# Altium schematic symbol library LATTICEPLDS_Library.SchLib: 291 symbols (part 4 of 32)
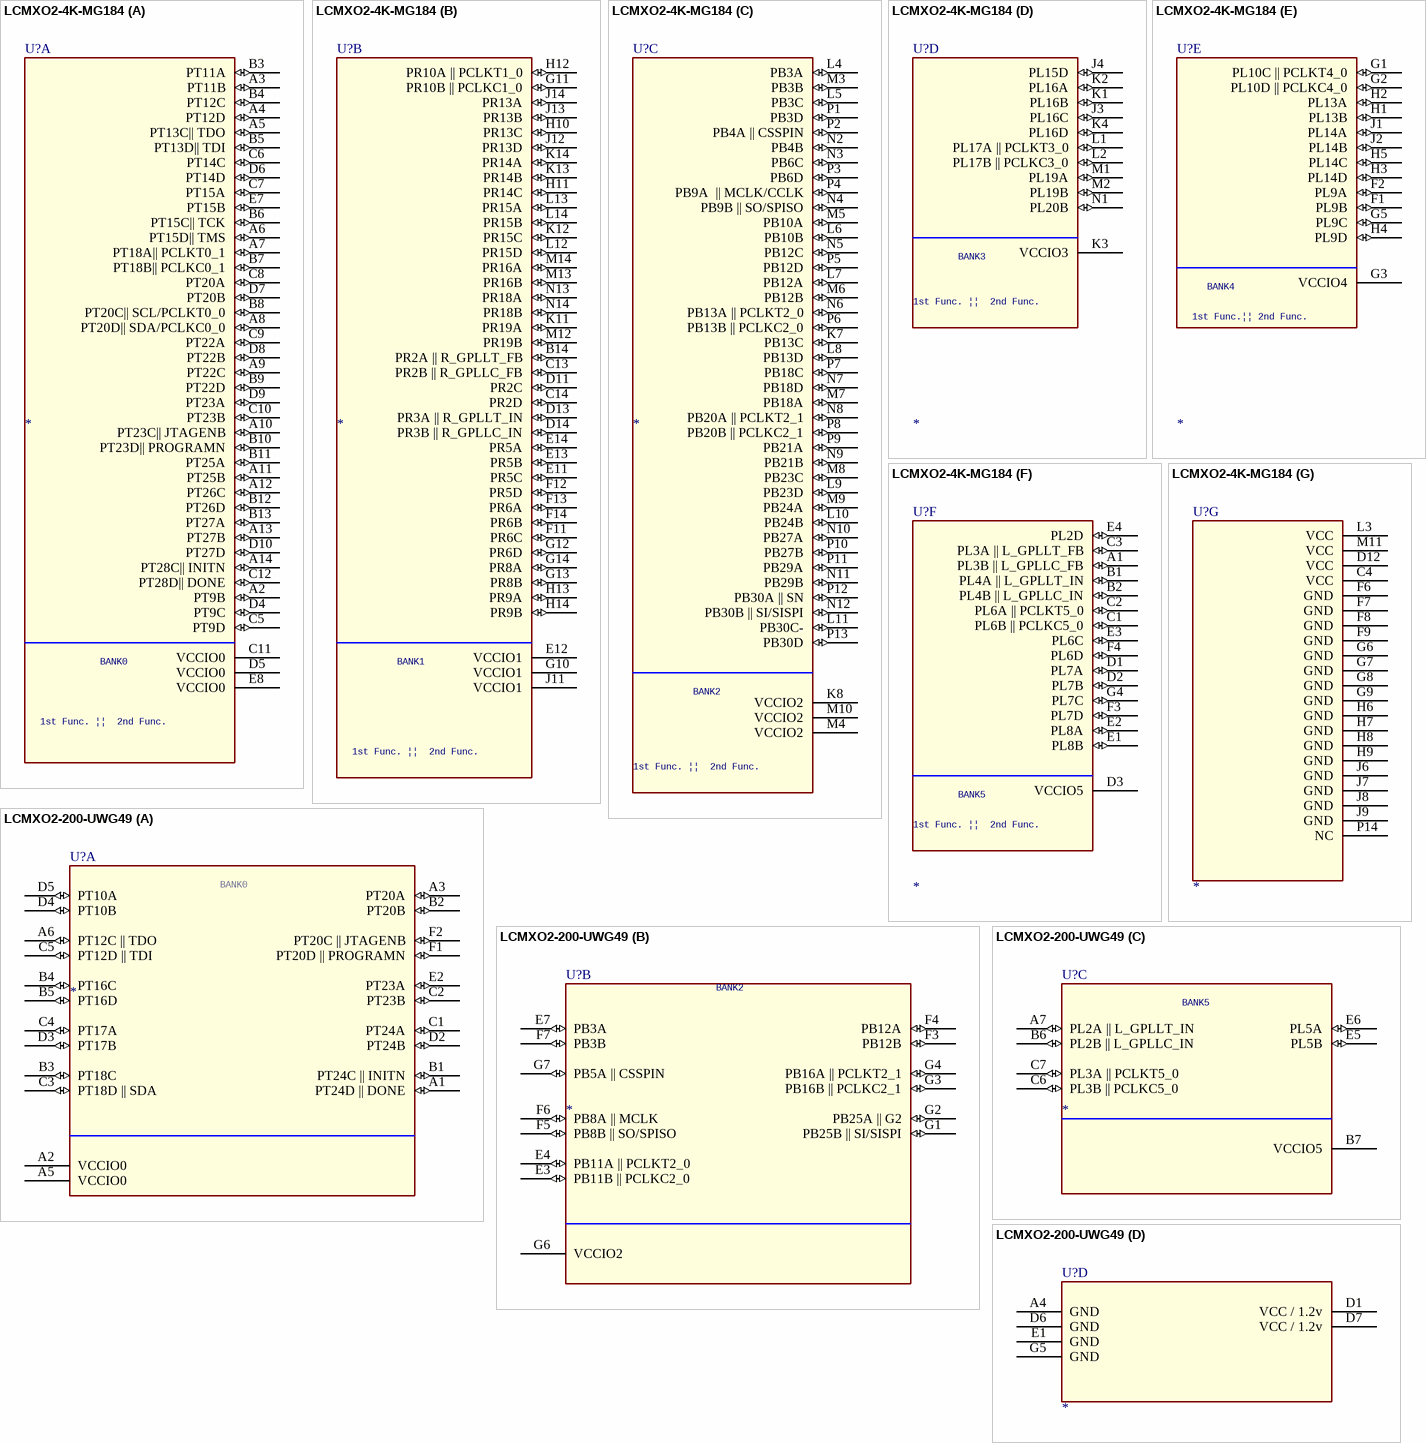
[diagram p306: symbols LCMXO2-4K-MG184 to LCMXO2-200-UWG49]

## LCMXO2-4K-MG184
designator U?
SPLIT_INST: TRUE; SWAP_INFO: (S1+S2+S3+S4+S5+S6+S7)
part A pins: A2 PT9B (io), A3 PT11B (io), A4 PT12D (io), A5 PT13C|| TDO (io), A6 PT15D|| TMS (io), A7 PT18A|| PCLKT0_1 (io), A8 PT20D|| SDA/PCLKC0_0 (io), A9 PT22C (io), A10 PT23C|| JTAGENB (io), A11 PT25B (io), A12 PT26C (io), A13 PT27B (io), A14 PT28C|| INITN (io), B3 PT11A (io), B4 PT12C (io), B5 PT13D|| TDI (io), B6 PT15C|| TCK (io), B7 PT18B|| PCLKC0_1 (io), B8 PT20C|| SCL/PCLKT0_0 (io), B9 PT22D (io), B10 PT23D|| PROGRAMN (io), B11 PT25A (io), B12 PT26D (io), B13 PT27A (io), C5 PT9D (io), C6 PT14C (io), C7 PT15A (io), C8 PT20A (io), C9 PT22A (io), C10 PT23B (io), C11 VCCIO0 (power), C12 PT28D|| DONE (io), D4 PT9C (io), D5 VCCIO0 (power), D6 PT14D (io), D7 PT20B (io), D8 PT22B (io), D9 PT23A (io), D10 PT27D (io), E7 PT15B (io), E8 VCCIO0 (power)
part B pins: B14 PR2A || R_GPLLT_FB (io), C13 PR2B || R_GPLLC_FB (io), C14 PR2D (io), D11 PR2C (io), D13 PR3A || R_GPLLT_IN (io), D14 PR3B || R_GPLLC_IN (io), E11 PR5C (io), E12 VCCIO1 (power), E13 PR5B (io), E14 PR5A (io), F11 PR6C (io), F12 PR5D (io), F13 PR6A (io), F14 PR6B (io), G10 VCCIO1 (power), G11 PR10B || PCLKC1_0 (io), G12 PR6D (io), G13 PR8B (io), G14 PR8A (io), H10 PR13C (io), H11 PR14C (io), H12 PR10A || PCLKT1_0 (io), H13 PR9A (io), H14 PR9B (io), J11 VCCIO1 (power), J12 PR13D (io), J13 PR13B (io), J14 PR13A (io), K11 PR19A (io), K12 PR15C (io), K13 PR14B (io), K14 PR14A (io), L12 PR15D (io), L13 PR15A (io), L14 PR15B (io), M12 PR19B (io), M13 PR16B (io), M14 PR16A (io), N13 PR18A (io), N14 PR18B (io)
part C pins: K7 PB13C (io), K8 VCCIO2 (power), L4 PB3A (io), L5 PB3C (io), L6 PB10B (io), L7 PB12A (io), L8 PB13D (io), L9 PB23D (io), L10 PB24B (io), L11 PB30C- (io), M3 PB3B (io), M4 VCCIO2 (power), M5 PB10A (io), M6 PB12B (io), M7 PB18A (io), M8 PB23C (io), M9 PB24A (io), M10 VCCIO2 (power), N2 PB4B (io), N3 PB6C (io), N4 PB9B || SO/SPISO (io), N5 PB12C (io), N6 PB13A || PCLKT2_0 (io), N7 PB18D (io), N8 PB20A || PCLKT2_1 (io), N9 PB21B (io), N10 PB27A (io), N11 PB29B (io), N12 PB30B || SI/SISPI (io), P1 PB3D (io), P2 PB4A || CSSPIN (io), P3 PB6D (io), P4 PB9A  || MCLK/CCLK (io), P5 PB12D (io), P6 PB13B || PCLKC2_0 (io), P7 PB18C (io), P8 PB20B || PCLKC2_1 (io), P9 PB21A (io), P10 PB27B (io), P11 PB29A (io), P12 PB30A || SN (io), P13 PB30D (io)
part D pins: J3 PL16C (io), J4 PL15D (io), K1 PL16B (io), K2 PL16A (io), K3 VCCIO3 (power), K4 PL16D (io), L1 PL17A || PCLKT3_0 (io), L2 PL17B || PCLKC3_0 (io), M1 PL19A (io), M2 PL19B (io), N1 PL20B (io)
part E pins: F1 PL9B (io), F2 PL9A (io), G1 PL10C || PCLKT4_0 (io), G2 PL10D || PCLKC4_0 (io), G3 VCCIO4 (power), G5 PL9C (io), H1 PL13B (io), H2 PL13A (io), H3 PL14D (io), H4 PL9D (io), H5 PL14C (io), J1 PL14A (io), J2 PL14B (io)
part F pins: A1 PL3B || L_GPLLC_FB (io), B1 PL4A || L_GPLLT_IN (io), B2 PL4B || L_GPLLC_IN (io), C1 PL6B || PCLKC5_0 (io), C2 PL6A || PCLKT5_0 (io), C3 PL3A || L_GPLLT_FB (io), D1 PL7A (io), D2 PL7B (io), D3 VCCIO5 (power), E1 PL8B (io), E2 PL8A (io), E3 PL6C (io), E4 PL2D (io), F3 PL7D (io), F4 PL6D (io), G4 PL7C (io)
part G pins: C4 VCC (power), D12 VCC (power), F6 GND (power), F7 GND (power), F8 GND (power), F9 GND (power), G6 GND (power), G7 GND (power), G8 GND (power), G9 GND (power), H6 GND (power), H7 GND (power), H8 GND (power), H9 GND (power), J6 GND (power), J7 GND (power), J8 GND (power), J9 GND (power), L3 VCC (power), M11 VCC (power), P14 NC
part A text: BANK0; 1st Func. ||  2nd Func.
part B text: BANK1; 1st Func. ||  2nd Func.
part C text: BANK2; 1st Func. ||  2nd Func.
part D text: BANK3; 1st Func. ||  2nd Func.
part E text: BANK4; 1st Func.|| 2nd Func.
part F text: BANK5; 1st Func. ||  2nd Func.

## LCMXO2-200-UWG49
designator U?
SWAP_INFO: (S1+S2+S3+S4); SPLIT_INST: TRUE
part A pins: A1 PT24D || DONE (io), A2 VCCIO0 (power), A3 PT20A (io), A5 VCCIO0 (power), A6 PT12C || TDO (io), B1 PT24C || INITN (io), B2 PT20B (io), B3 PT18C (io), B4 PT16C (io), B5 PT16D (io), C1 PT24A (io), C2 PT23B (io), C3 PT18D || SDA (io), C4 PT17A (io), C5 PT12D || TDI (io), D2 PT24B (io), D3 PT17B (io), D4 PT10B (io), D5 PT10A (io), E2 PT23A (io), F1 PT20D || PROGRAMN (io), F2 PT20C || JTAGENB (io)
part B pins: E3 PB11B || PCLKC2_0 (io), E4 PB11A || PCLKT2_0 (io), E7 PB3A (io), F3 PB12B (io), F4 PB12A (io), F5 PB8B || SO/SPISO (io), F6 PB8A || MCLK (io), F7 PB3B (io), G1 PB25B || SI/SISPI (io), G2 PB25A || G2 (io), G3 PB16B || PCLKC2_1 (io), G4 PB16A || PCLKT2_1 (io), G6 VCCIO2 (power), G7 PB5A || CSSPIN (io)
part C pins: A7 PL2A || L_GPLLT_IN (io), B6 PL2B || L_GPLLC_IN (io), B7 VCCIO5 (power), C6 PL3B || PCLKC5_0 (io), C7 PL3A || PCLKT5_0 (io), E5 PL5B (io), E6 PL5A (io)
part D pins: A4 GND (power), D1 VCC / 1.2v (power), D6 GND (power), D7 VCC / 1.2v (power), E1 GND (power), G5 GND (power)
part A text: BANK0
part B text: BANK2
part C text: BANK5

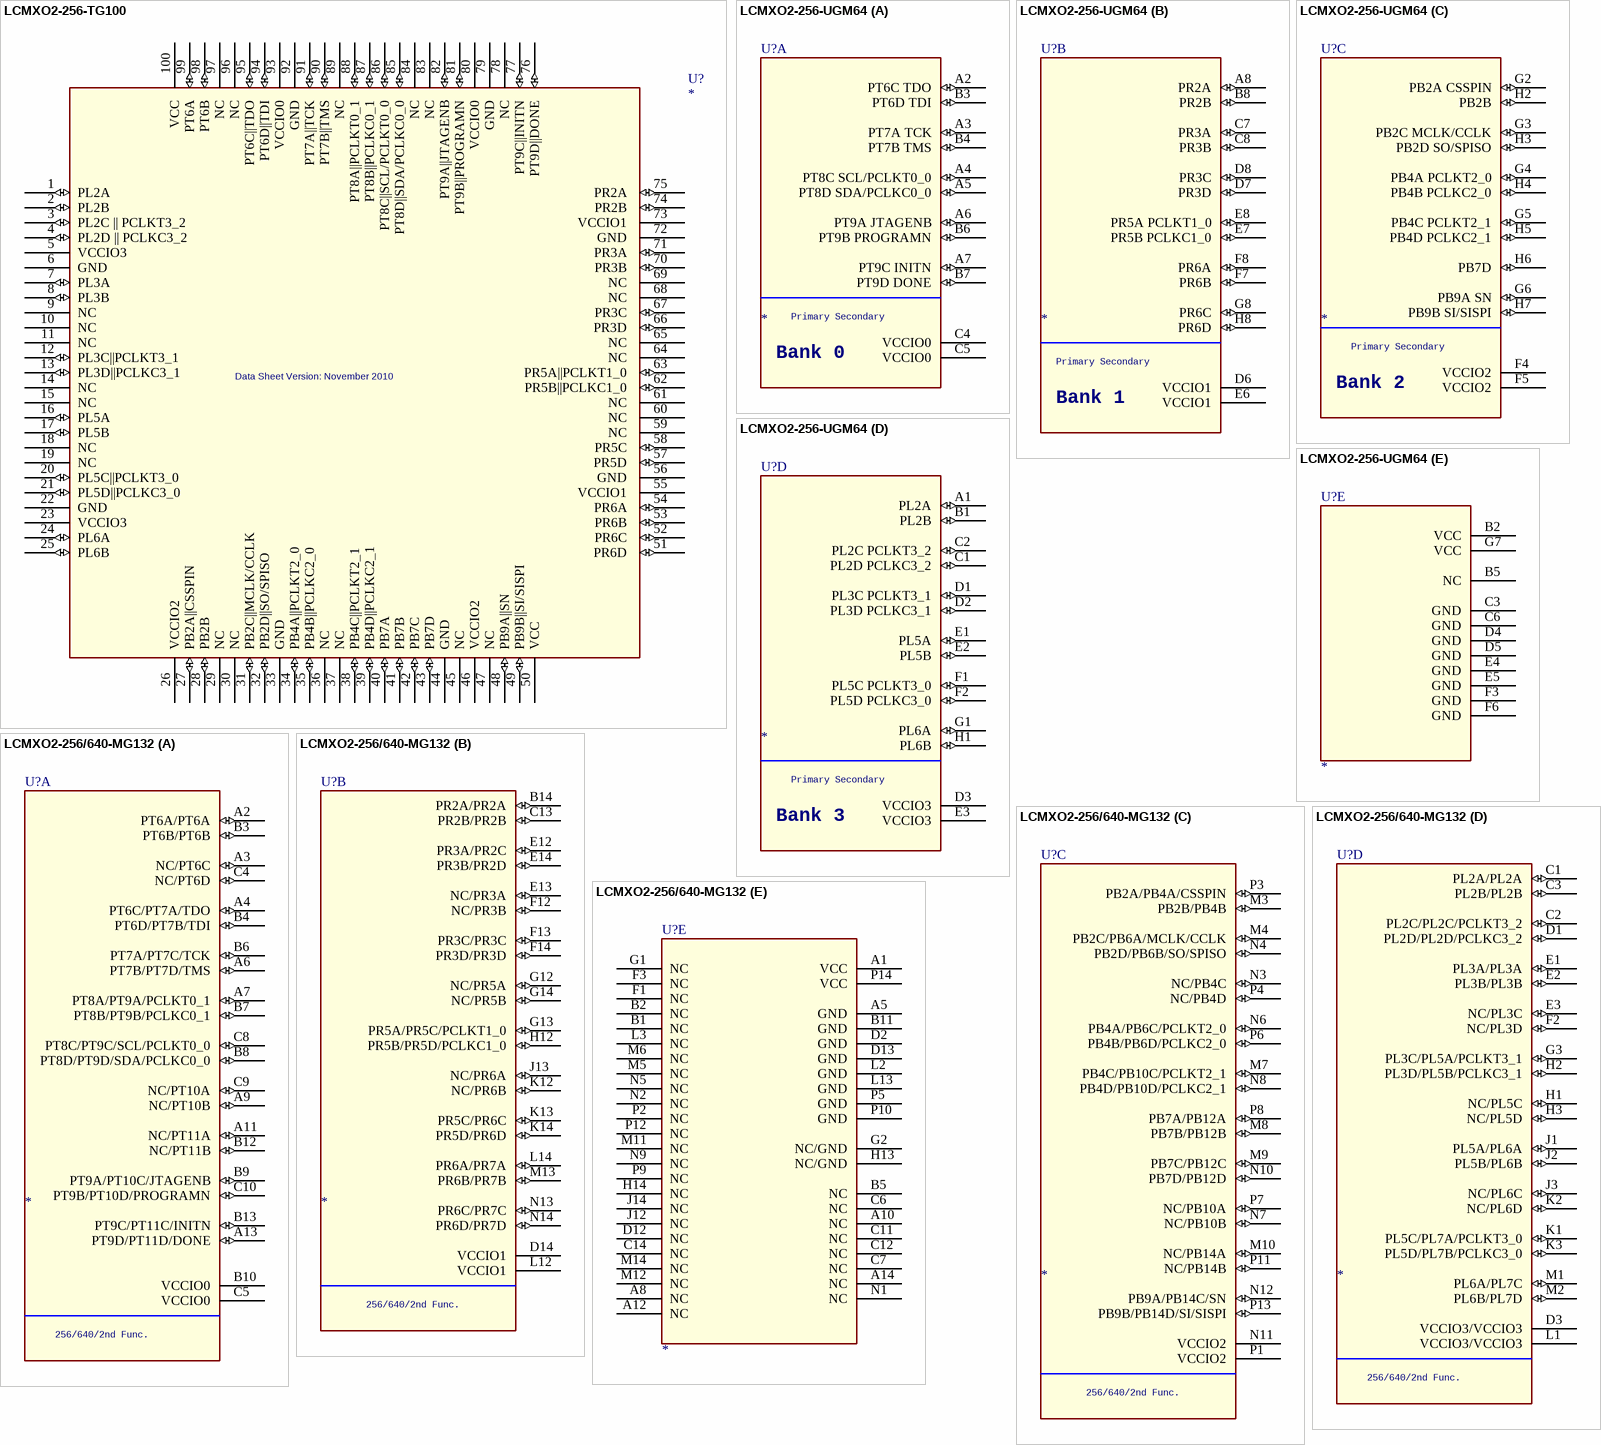
[diagram p36: symbols LCMXO2-256-TG100 to LCMXO2-256/640-MG132]

## LCMXO2-256-TG100
designator U?  Data Sheet Version: November 2010
pins: 1 PL2A  (io), 2 PL2B  (io), 3 PL2C || PCLKT3_2  (io), 4 PL2D || PCLKC3_2  (io), 5 VCCIO3  (power), 6 GND  (power), 7 PL3A  (io), 8 PL3B  (io), 9 NC , 10 NC , 11 NC , 12 PL3C||PCLKT3_1  (io), 13 PL3D||PCLKC3_1  (io), 14 NC , 15 NC , 16 PL5A  (io), 17 PL5B  (io), 18 NC , 19 NC , 20 PL5C||PCLKT3_0  (io), 21 PL5D||PCLKC3_0  (io), 22 GND  (power), 23 VCCIO3  (power), 24 PL6A  (io), 25 PL6B  (io), 26 VCCIO2  (power), 27 PB2A||CSSPIN  (io), 28 PB2B  (io), 29 NC , 30 NC , 31 PB2C||MCLK/CCLK  (io), 32 PB2D||SO/SPISO  (io), 33 GND  (power), 34 PB4A||PCLKT2_0  (io), 35 PB4B||PCLKC2_0  (io), 36 NC , 37 NC , 38 PB4C||PCLKT2_1  (io), 39 PB4D||PCLKC2_1  (io), 40 PB7A  (io), 41 PB7B  (io), 42 PB7C  (io), 43 PB7D  (io), 44 GND  (power), 45 NC , 46 VCCIO2  (power), 47 NC , 48 PB9A||SN  (io), 49 PB9B||SI/SISPI  (io), 50 VCC  (power), 51 PR6D  (io), 52 PR6C  (io), 53 PR6B  (io), 54 PR6A  (io), 55 VCCIO1  (power), 56 GND  (power), 57 PR5D  (io), 58 PR5C  (io), 59 NC , 60 NC , 61 NC , 62 PR5B||PCLKC1_0  (io), 63 PR5A||PCLKT1_0  (io), 64 NC , 65 NC , 66 PR3D  (io), 67 PR3C  (io), 68 NC , 69 NC , 70 PR3B  (io), 71 PR3A  (io), 72 GND  (power), 73 VCCIO1  (power), 74 PR2B  (io), 75 PR2A  (io), 76 PT9D||DONE  (io), 77 PT9C||INITN  (io), 78 NC , 79 GND  (power), 80 VCCIO0  (power), 81 PT9B||PROGRAMN  (io), 82 PT9A||JTAGENB  (io), 83 NC , 84 NC , 85 PT8D||SDA/PCLKC0_0  (io), 86 PT8C||SCL/PCLKT0_0  (io), 87 PT8B||PCLKC0_1  (io), 88 PT8A||PCLKT0_1  (io), 89 NC , 90 PT7B||TMS  (io), 91 PT7A||TCK  (io), 92 GND  (power), 93 VCCIO0  (power), 94 PT6D||TDI  (io), 95 PT6C||TDO  (io), 96 NC , 97 NC , 98 PT6B  (io), 99 PT6A  (io), 100 VCC  (power)

## LCMXO2-256-UGM64
designator U?
SPLIT_INST: TRUE; SWAP_INFO: (S1+S2+S3+S4+S5)
part A pins: A2 PT6C TDO (io), A3 PT7A TCK (io), A4 PT8C SCL/PCLKT0_0 (io), A5 PT8D SDA/PCLKC0_0 (io), A6 PT9A JTAGENB (io), A7 PT9C INITN (io), B3 PT6D TDI (io), B4 PT7B TMS (io), B6 PT9B PROGRAMN (io), B7 PT9D DONE (io), C4 VCCIO0 (power), C5 VCCIO0 (power)
part B pins: A8 PR2A (io), B8 PR2B (io), C7 PR3A (io), C8 PR3B (io), D6 VCCIO1 (power), D7 PR3D (io), D8 PR3C (io), E6 VCCIO1 (power), E7 PR5B PCLKC1_0 (io), E8 PR5A PCLKT1_0 (io), F7 PR6B (io), F8 PR6A (io), G8 PR6C (io), H8 PR6D (io)
part C pins: F4 VCCIO2 (power), F5 VCCIO2 (power), G2 PB2A CSSPIN (io), G3 PB2C MCLK/CCLK (io), G4 PB4A PCLKT2_0 (io), G5 PB4C PCLKT2_1 (io), G6 PB9A SN (io), H2 PB2B (io), H3 PB2D SO/SPISO (io), H4 PB4B PCLKC2_0 (io), H5 PB4D PCLKC2_1 (io), H6 PB7D (io), H7 PB9B SI/SISPI (io)
part D pins: A1 PL2A (io), B1 PL2B (io), C1 PL2D PCLKC3_2 (io), C2 PL2C PCLKT3_2 (io), D1 PL3C PCLKT3_1 (io), D2 PL3D PCLKC3_1 (io), D3 VCCIO3 (power), E1 PL5A (io), E2 PL5B (io), E3 VCCIO3 (power), F1 PL5C PCLKT3_0 (io), F2 PL5D PCLKC3_0 (io), G1 PL6A (io), H1 PL6B (io)
part E pins: B2 VCC (power), B5 NC, C3 GND (power), C6 GND (power), D4 GND (power), D5 GND (power), E4 GND (power), E5 GND (power), F3 GND (power), F6 GND (power), G7 VCC (power)
part A text: Primary Secondary; Bank 0
part B text: Primary Secondary; Bank 1
part C text: Primary Secondary; Bank 2
part D text: Primary Secondary; Bank 3

## LCMXO2-256/640-MG132
designator U?
SPLIT_INST: TRUE; SWAP_INFO: (S1+S2+S3+S4+S5)
part A pins: A2 PT6A/PT6A (io), A3 NC/PT6C (io), A4 PT6C/PT7A/TDO (io), A6 PT7B/PT7D/TMS (io), A7 PT8A/PT9A/PCLKT0_1 (io), A9 NC/PT10B (io), A11 NC/PT11A (io), A13 PT9D/PT11D/DONE (io), B3 PT6B/PT6B (io), B4 PT6D/PT7B/TDI (io), B6 PT7A/PT7C/TCK (io), B7 PT8B/PT9B/PCLKC0_1 (io), B8 PT8D/PT9D/SDA/PCLKC0_0 (io), B9 PT9A/PT10C/JTAGENB (io), B10 VCCIO0 (power), B12 NC/PT11B (io), B13 PT9C/PT11C/INITN (io), C4 NC/PT6D (io), C5 VCCIO0 (power), C8 PT8C/PT9C/SCL/PCLKT0_0 (io), C9 NC/PT10A (io), C10 PT9B/PT10D/PROGRAMN (io)
part B pins: B14 PR2A/PR2A (io), C13 PR2B/PR2B (io), D14 VCCIO1 (power), E12 PR3A/PR2C (io), E13 NC/PR3A (io), E14 PR3B/PR2D (io), F12 NC/PR3B (io), F13 PR3C/PR3C (io), F14 PR3D/PR3D (io), G12 NC/PR5A (io), G13 PR5A/PR5C/PCLKT1_0 (io), G14 NC/PR5B (io), H12 PR5B/PR5D/PCLKC1_0 (io), J13 NC/PR6A (io), K12 NC/PR6B (io), K13 PR5C/PR6C (io), K14 PR5D/PR6D (io), L12 VCCIO1 (power), L14 PR6A/PR7A (io), M13 PR6B/PR7B (io), N13 PR6C/PR7C (io), N14 PR6D/PR7D (io)
part C pins: M3 PB2B/PB4B (io), M4 PB2C/PB6A/MCLK/CCLK (io), M7 PB4C/PB10C/PCLKT2_1 (io), M8 PB7B/PB12B (io), M9 PB7C/PB12C (io), M10 NC/PB14A (io), N3 NC/PB4C (io), N4 PB2D/PB6B/SO/SPISO (io), N6 PB4A/PB6C/PCLKT2_0 (io), N7 NC/PB10B (io), N8 PB4D/PB10D/PCLKC2_1 (io), N10 PB7D/PB12D (io), N11 VCCIO2 (power), N12 PB9A/PB14C/SN (io), P1 VCCIO2 (power), P3 PB2A/PB4A/CSSPIN (io), P4 NC/PB4D (io), P6 PB4B/PB6D/PCLKC2_0 (io), P7 NC/PB10A (io), P8 PB7A/PB12A (io), P11 NC/PB14B (io), P13 PB9B/PB14D/SI/SISPI (io)
part D pins: C1 PL2A/PL2A (io), C2 PL2C/PL2C/PCLKT3_2 (io), C3 PL2B/PL2B (io), D1 PL2D/PL2D/PCLKC3_2 (io), D3 VCCIO3/VCCIO3 (power), E1 PL3A/PL3A (io), E2 PL3B/PL3B (io), E3 NC/PL3C (io), F2 NC/PL3D (io), G3 PL3C/PL5A/PCLKT3_1 (io), H1 NC/PL5C (io), H2 PL3D/PL5B/PCLKC3_1 (io), H3 NC/PL5D (io), J1 PL5A/PL6A (io), J2 PL5B/PL6B (io), J3 NC/PL6C (io), K1 PL5C/PL7A/PCLKT3_0 (io), K2 NC/PL6D (io), K3 PL5D/PL7B/PCLKC3_0 (io), L1 VCCIO3/VCCIO3 (power), M1 PL6A/PL7C (io), M2 PL6B/PL7D (io)
part E pins: A1 VCC (power), A5 GND (power), A8 NC, A10 NC, A12 NC, A14 NC, B1 NC, B2 NC, B5 NC, B11 GND (power), C6 NC, C7 NC, C11 NC, C12 NC, C14 NC, D2 GND (power), D12 NC, D13 GND (power), F1 NC, F3 NC, G1 NC, G2 NC/GND (power), H13 NC/GND (power), H14 NC, J12 NC, J14 NC, L2 GND (power), L3 NC, L13 GND (power), M5 NC, M6 NC, M11 NC, M12 NC, M14 NC, N1 NC, N2 NC, N5 NC, N9 NC, P2 NC, P5 GND (power), P9 NC, P10 GND (power), P12 NC, P14 VCC (power)
part A text: 256/640/2nd Func.
part B text: 256/640/2nd Func.
part C text: 256/640/2nd Func.
part D text: 256/640/2nd Func.

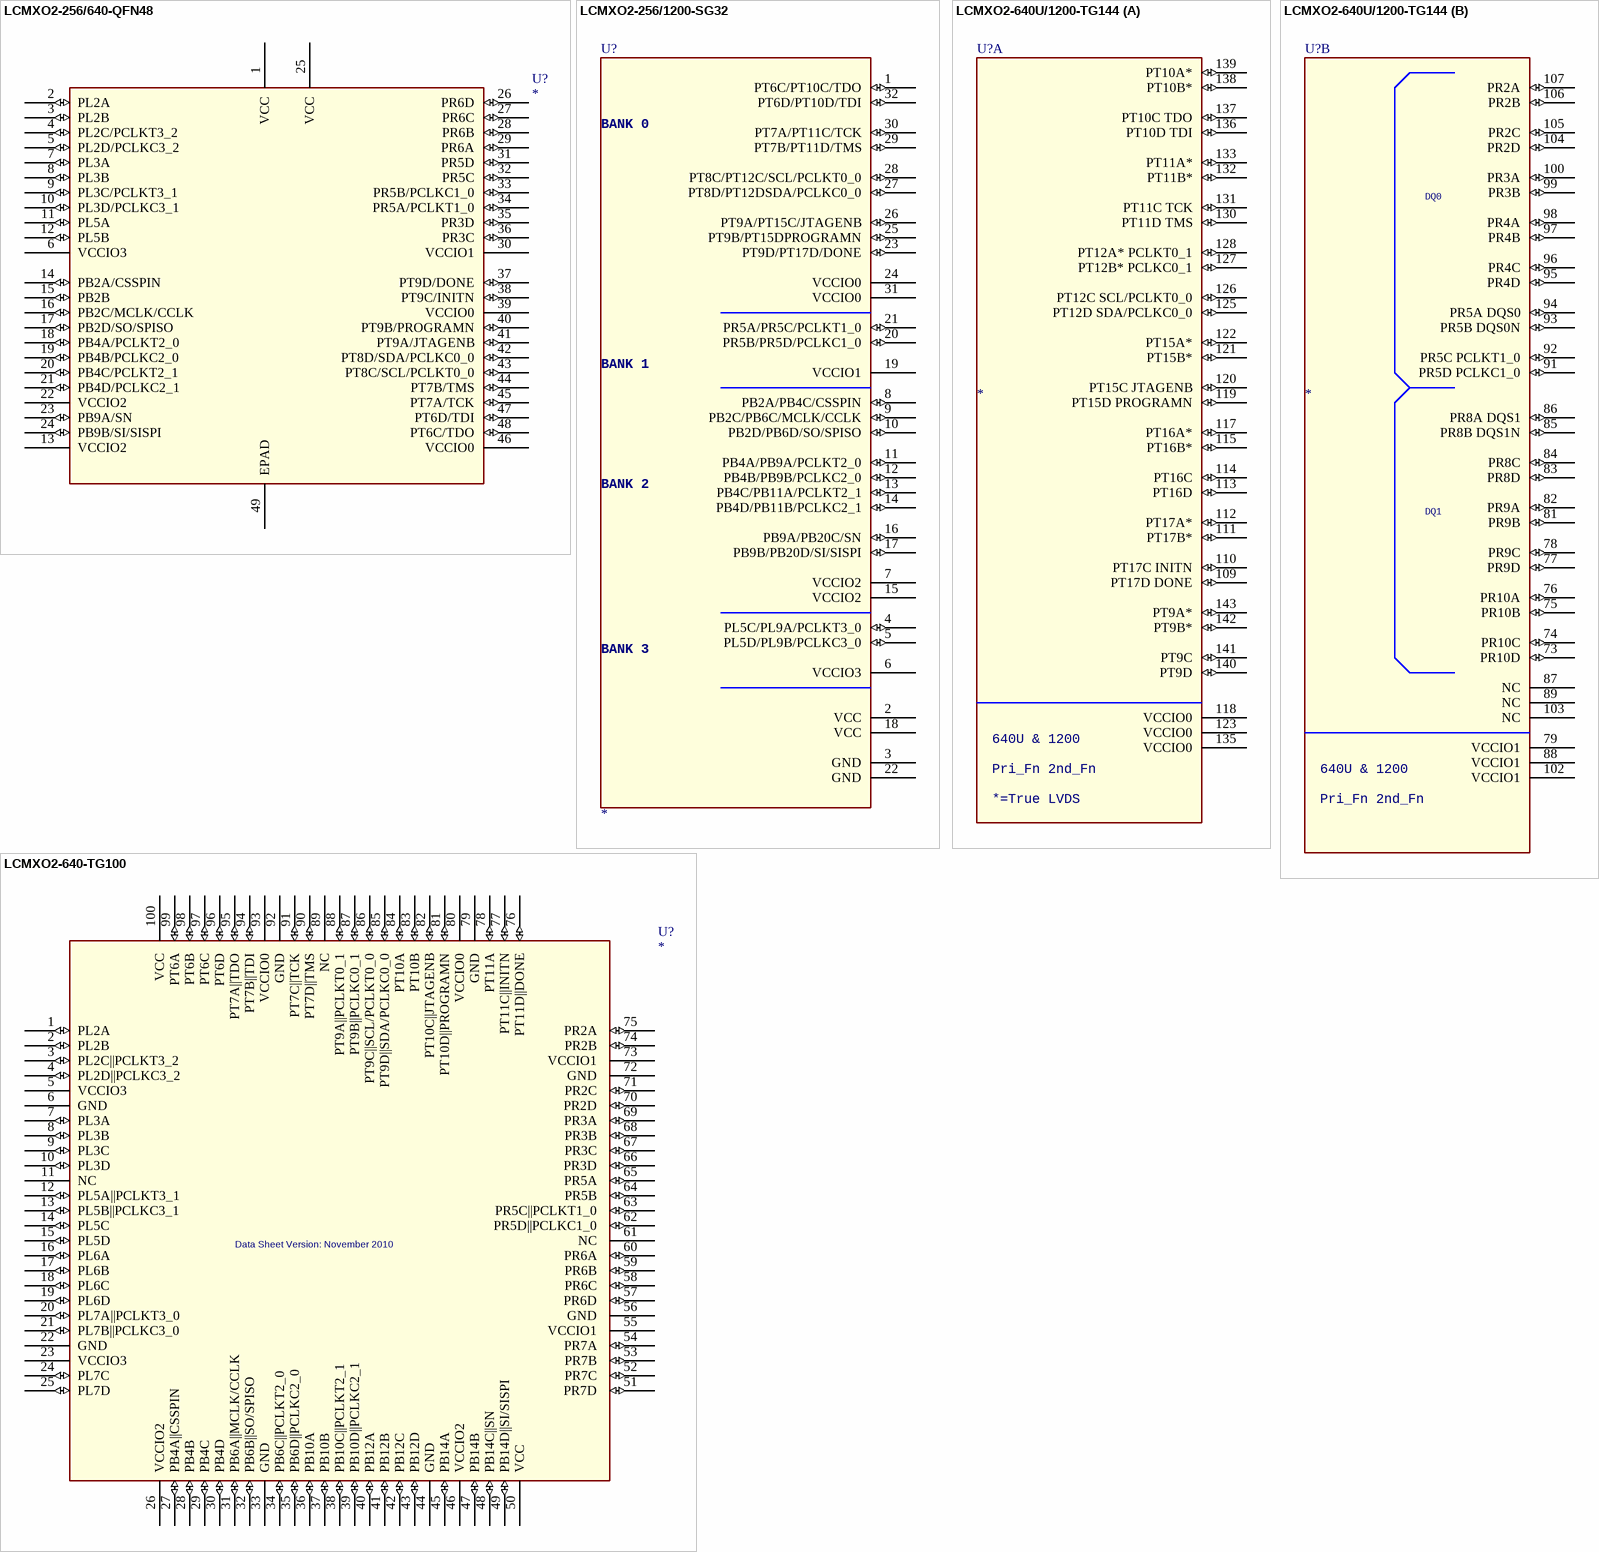
[diagram p37: symbols LCMXO2-256/640-QFN48 to LCMXO2-640U/1200-TG144]

## LCMXO2-256/640-QFN48
designator U?
pins: 1 VCC (power), 2 PL2A (io), 3 PL2B (io), 4 PL2C/PCLKT3_2 (io), 5 PL2D/PCLKC3_2 (io), 6 VCCIO3 (power), 7 PL3A (io), 8 PL3B (io), 9 PL3C/PCLKT3_1 (io), 10 PL3D/PCLKC3_1 (io), 11 PL5A (io), 12 PL5B (io), 13 VCCIO2 (power), 14 PB2A/CSSPIN (io), 15 PB2B (io), 16 PB2C/MCLK/CCLK (io), 17 PB2D/SO/SPISO (io), 18 PB4A/PCLKT2_0 (io), 19 PB4B/PCLKC2_0 (io), 20 PB4C/PCLKT2_1 (io), 21 PB4D/PCLKC2_1 (io), 22 VCCIO2 (power), 23 PB9A/SN (io), 24 PB9B/SI/SISPI (io), 25 VCC (power), 26 PR6D (io), 27 PR6C (io), 28 PR6B (io), 29 PR6A (io), 30 VCCIO1 (power), 31 PR5D (io), 32 PR5C (io), 33 PR5B/PCLKC1_0 (io), 34 PR5A/PCLKT1_0 (io), 35 PR3D (io), 36 PR3C (io), 37 PT9D/DONE (io), 38 PT9C/INITN (io), 39 VCCIO0 (power), 40 PT9B/PROGRAMN (io), 41 PT9A/JTAGENB (io), 42 PT8D/SDA/PCLKC0_0 (io), 43 PT8C/SCL/PCLKT0_0 (io), 44 PT7B/TMS (io), 45 PT7A/TCK (io), 46 VCCIO0 (power), 47 PT6D/TDI (io), 48 PT6C/TDO (io), 49 EPAD (power)

## LCMXO2-256/1200-SG32
designator U?
pins: 1 PT6C/PT10C/TDO (io), 2 VCC (power), 3 GND (power), 4 PL5C/PL9A/PCLKT3_0 (io), 5 PL5D/PL9B/PCLKC3_0 (io), 6 VCCIO3 (power), 7 VCCIO2 (power), 8 PB2A/PB4C/CSSPIN (io), 9 PB2C/PB6C/MCLK/CCLK (io), 10 PB2D/PB6D/SO/SPISO (io), 11 PB4A/PB9A/PCLKT2_0 (io), 12 PB4B/PB9B/PCLKC2_0 (io), 13 PB4C/PB11A/PCLKT2_1 (io), 14 PB4D/PB11B/PCLKC2_1 (io), 15 VCCIO2 (power), 16 PB9A/PB20C/SN (io), 17 PB9B/PB20D/SI/SISPI (io), 18 VCC (power), 19 VCCIO1 (power), 20 PR5B/PR5D/PCLKC1_0 (io), 21 PR5A/PR5C/PCLKT1_0 (io), 22 GND (power), 23 PT9D/PT17D/DONE (io), 24 VCCIO0 (power), 25 PT9B/PT15DPROGRAMN (io), 26 PT9A/PT15C/JTAGENB (io), 27 PT8D/PT12DSDA/PCLKC0_0 (io), 28 PT8C/PT12C/SCL/PCLKT0_0 (io), 29 PT7B/PT11D/TMS (io), 30 PT7A/PT11C/TCK (io), 31 VCCIO0 (power), 32 PT6D/PT10D/TDI (io)
text: BANK 0; BANK 1; BANK 2; BANK 3

## LCMXO2-640-TG100
designator U?  Data Sheet Version: November 2010
pins: 1 PL2A  (io), 2 PL2B  (io), 3 PL2C||PCLKT3_2  (io), 4 PL2D||PCLKC3_2  (io), 5 VCCIO3  (power), 6 GND  (power), 7 PL3A  (io), 8 PL3B  (io), 9 PL3C  (io), 10 PL3D  (io), 11 NC , 12 PL5A||PCLKT3_1  (io), 13 PL5B||PCLKC3_1  (io), 14 PL5C  (io), 15 PL5D  (io), 16 PL6A  (io), 17 PL6B  (io), 18 PL6C  (io), 19 PL6D  (io), 20 PL7A||PCLKT3_0  (io), 21 PL7B||PCLKC3_0  (io), 22 GND  (power), 23 VCCIO3  (power), 24 PL7C  (io), 25 PL7D  (io), 26 VCCIO2  (power), 27 PB4A||CSSPIN  (io), 28 PB4B  (io), 29 PB4C  (io), 30 PB4D  (io), 31 PB6A||MCLK/CCLK  (io), 32 PB6B||SO/SPISO  (io), 33 GND  (power), 34 PB6C||PCLKT2_0  (io), 35 PB6D||PCLKC2_0  (io), 36 PB10A  (io), 37 PB10B  (io), 38 PB10C||PCLKT2_1  (io), 39 PB10D||PCLKC2_1  (io), 40 PB12A  (io), 41 PB12B  (io), 42 PB12C  (io), 43 PB12D  (io), 44 GND  (power), 45 PB14A  (io), 46 VCCIO2  (power), 47 PB14B  (io), 48 PB14C||SN  (io), 49 PB14D||SI/SISPI  (io), 50 VCC  (power), 51 PR7D  (io), 52 PR7C  (io), 53 PR7B  (io), 54 PR7A  (io), 55 VCCIO1  (power), 56 GND  (power), 57 PR6D  (io), 58 PR6C  (io), 59 PR6B  (io), 60 PR6A  (io), 61 NC , 62 PR5D||PCLKC1_0  (io), 63 PR5C||PCLKT1_0  (io), 64 PR5B  (io), 65 PR5A  (io), 66 PR3D  (io), 67 PR3C  (io), 68 PR3B  (io), 69 PR3A  (io), 70 PR2D  (io), 71 PR2C  (io), 72 GND  (power), 73 VCCIO1  (power), 74 PR2B  (io), 75 PR2A  (io), 76 PT11D||DONE  (io), 77 PT11C||INITN  (io), 78 PT11A  (io), 79 GND  (power), 80 VCCIO0  (power), 81 PT10D||PROGRAMN  (io), 82 PT10C||JTAGENB  (io), 83 PT10B  (io), 84 PT10A  (io), 85 PT9D||SDA/PCLKC0_0  (io), 86 PT9C||SCL/PCLKT0_0  (io), 87 PT9B||PCLKC0_1  (io), 88 PT9A||PCLKT0_1  (io), 89 NC , 90 PT7D||TMS  (io), 91 PT7C||TCK  (io), 92 GND  (power), 93 VCCIO0  (power), 94 PT7B||TDI  (io), 95 PT7A||TDO  (io), 96 PT6D  (io), 97 PT6C  (io), 98 PT6B  (io), 99 PT6A  (io), 100 VCC  (power)
